# Altium integrated library CB3-ECB.IntLib: 66 symbols (continued)
## CMP-062-000000-4
designator R?, comment value 10kΩ  (hidden comment: EXB-28V103JX)
Res Thick Film Array 10KΩ 5% ±200ppm/°C ISOL 8-Pin 0804(4 X 0402) Convex SMD Automotive T/R; Circuit Type: Isolated; Number of Contacts: 8; Number of Elements: 4; Power Dissipation: 63mW; Power Per Element: 62.5mW; Voltage Rating (DC): 100V; Voltage Rating: 50V; Tolerance: 5%; Case/Package: 0804; Case Code (Imperial): 0402; Case Code (Metric): 1005; Depth: 1mm; Height: 0.35mm; Lead Free: Lead Free; Length: 2mm; Max Operating Temperature: 125°C; Military Standard: Not; Min Operating Temperature: -55°C; Mounting Technology: Surface Mount; Number of Resistors: 4; Package Quantity: 1; Packaging: Tape and Reel; Pins: 8; Power Rating: 62.5mW; Radiation Hardening: No; Reach SVHC Compliant: Unknown; Resistance Tolerance: 5%; RoHS Compliant: Yes; Series: EXB; Technology: THICK FILM; Temperature Coefficient: 200ppm/°C; Terminal Pitch: 0.5mm; Termination: Convex; Width: 1mm
footprint RESQUAD0804 (General 0804 Quad Resisor Array Footprint, Body 2.0x1.2mm)
part A pins: 1, 8
part B pins: 2, 7
part C pins: 3, 6
part D pins: 4, 5

## CMP-0062-01754-3
designator U?, comment LM2937IMP-3.3/NOPB
400mA and 500mA Voltage Regulator, 4-pin SOT-223, Pb-Free; Manufacturer: Texas Instruments; CompType: LDO IC; PowerWise: N; PackageTopMarking: XYTT*L69B; PackageReference: DCY0004A; PackageDescription: Molded SOT-223, 6.50 x 3.56 x 1.6mm Body, 4 Lead, 2.3mm Pitch; ComponentLink1Description: Datasheet URL; Code_IPC: SOT223-4; ComponentLink1URL: http://www.ti.com/general/docs/lit/getliterature.tsp?genericPartNumber=LM2937-3.3&fileType=pdf; RoHS: Y; PinCount: 4; Code_JEDEC: TO-261-AA
footprint DCY0004A_M (SOT223, 4-Leads, Body 6.7x3.7mm, Pitch 2.3mm, IPC Low Density)
footprint DCY0004A_N (SOT223, 4-Leads, Body 6.7x3.7mm, Pitch 2.3mm, IPC Medium Density)
footprint DCY0004A_L (SOT223, 4-Leads, Body 6.7x3.7mm, Pitch 2.3mm, IPC High Density)
pins: 1 IN (power), 2 GND (power), 3 OUT (power), 4 TAB (power)

## CMP-00068-6
designator FL?, comment BNX024H01L
EMI Filter Block 15A 50VDC Flat Style SMD Automotive Embossed T/R
footprint FP-BNX02-MFG (BNX02 Package)
pins: 1 B, 2 CB, 3 PSG, 4 CG

## CMP-070-000025-6
designator P?, comment M20-9990245
Connector Header Through Hole 2 position 0.100" (2.54mm); Max Current Rating: 3A; Voltage Rating (AC): 750V; Number of Contacts: 2; Contact Resistance: 25mR; Gender: Male; Insulation Resistance: 10GR; Mating Cycles: 300; Mated Stacking Heights: 16.54mm; Voltage: 50V; Packaging: Bulk; Min Operating Temperature: -40°C; Series: M20; Contact Material: Brass,Bronze; Number of Rows: 1; Housing Material: Nylon; Housing Color: Black; Termination: Solder; Contact Plating: Gold; Mounting Technology: Through Hole; Contact Type: Male Pin; Pitch: 2.54mm; Number of Positions: 2; Max Operating Temperature: 105°C; Reach SVHC Compliant: No; Length: 5.08mm; Radiation Hardening: No; Current Rating: 3A; Package Quantity: 1000; Orientation: Straight; Depth: 2.54mm; Fastening Type: Pull; Insulation Color: Black; Flammability Rating: UL94 V-0; Lead Pitch: 2.54mm; Insulation Material: Nylon; Contact Finish - Mating: GOLD; Current: 3A; Voltage Rating (DC): 750V; Number of Poles: 2; Contact Shape: Square; Working Voltage: 750V
footprint M20-9990245 (Connector Header Through Hole 2 position 0.100" (2.54mm))
pins: 1, 2

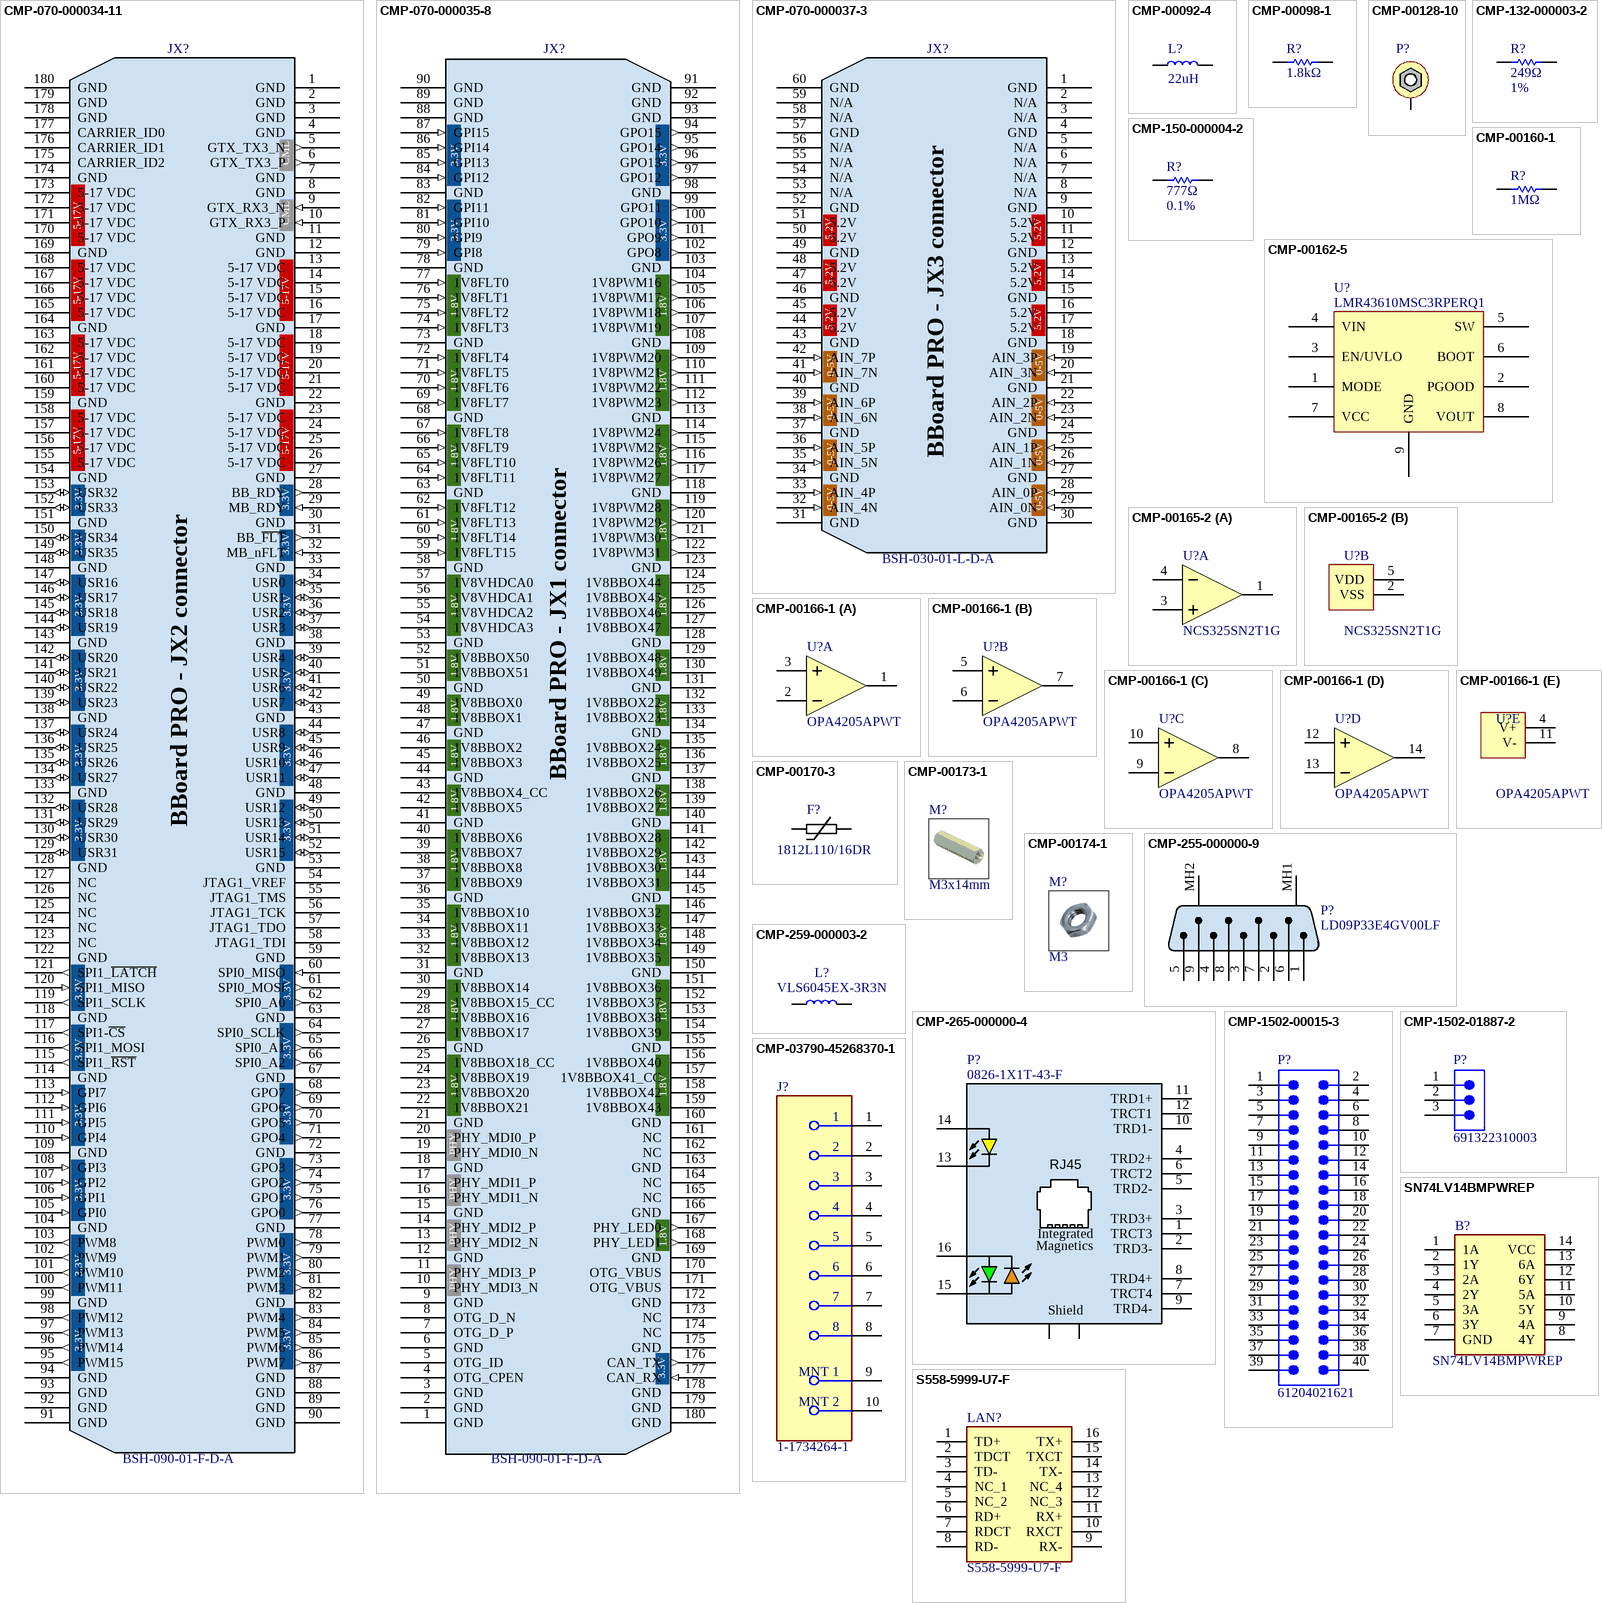
[diagram p2: symbols CMP-070-000034-11 to SN74LV14BMPWREP]

## CMP-070-000034-11
designator JX?, comment BSH-090-01-F-D-A
JX2 for BBoard; Max Current Rating: 1.25A; Number of Positions: 180; Max Voltage Rating (AC): 125V; Gender: Female; Mated Stacking Heights: 5mm; Pitch: 0.5mm; Contact Plating: Gold; Length: 51.27mm; Max Operating Temperature: 125°C; Depth: 7.24mm; Series: BSH; Mounting Technology: Surface Mount; Radiation Hardening: No; Orientation: Straight; Packaging: Bulk; Min Operating Temperature: -55°C; Termination: Solder; Number of Rows: 2; Contact Material: Bronze; Housing Material: Polymer; Height: 3.25mm; Number of Contacts: 180; RoHS Compliant: Yes
footprint BSH-090-01-F-D-A (Conn Micro Socket SKT 180 POS 0.5mm Solder ST SMD Automotive Tray)
pins: 1 GND (power), 2 GND (power), 3 GND (power), 4 GND (power), 5 GTX_TX3_N (out), 6 GTX_TX3_P (out), 7 GND (power), 8 GND (power), 9 GTX_RX3_N (in), 10 GTX_RX3_P (in), 11 GND (power), 12 GND (power), 13 5-17 VDC (power), 14 5-17 VDC (power), 15 5-17 VDC (power), 16 5-17 VDC (power), 17 GND (power), 18 5-17 VDC (power), 19 5-17 VDC (power), 20 5-17 VDC (power), 21 5-17 VDC (power), 22 GND (power), 23 5-17 VDC (power), 24 5-17 VDC (power), 25 5-17 VDC (power), 26 5-17 VDC (power), 27 GND (power), 28 BB_RDY (out), 29 MB_RDY (in), 30 GND (power), 31 BB_~{FLT} (out), 32 MB_nFLT (in), 33 GND (power), 34 USR0 (io), 35 USR1 (io), 36 USR2 (io), 37 USR3 (io), 38 GND (power), 39 USR4 (io), 40 USR5 (io), 41 USR6 (io), 42 USR7 (io), 43 GND (power), 44 USR8 (io), 45 USR9 (io), 46 USR10 (io), 47 USR11 (io), 48 GND (power), 49 USR12 (io), 50 USR13 (io), 51 USR14 (io), 52 USR15 (io), 53 GND (power), 54 JTAG1_VREF, 55 JTAG1_TMS, 56 JTAG1_TCK, 57 JTAG1_TDO, 58 JTAG1_TDI, 59 GND (power), 60 SPI0_MISO (in), 61 SPI0_MOSI (out), 62 SPI0_A0 (out), 63 GND (power), 64 SPI0_SCLK (out), 65 SPI0_A1 (out), 66 SPI0_A2 (out), 67 GND (power), 68 GPO7 (out), 69 GPO6 (out), 70 GPO5 (out), 71 GPO4 (out), 72 GND (power), 73 GPO3 (out), 74 GPO2 (out), 75 GPO1 (out), 76 GPO0 (out), 77 GND (power), 78 PWM0 (out), 79 PWM1 (out), 80 PWM2 (out), 81 PWM3 (out), 82 GND (power), 83 PWM4 (out), 84 PWM5 (out), 85 PWM6 (out), 86 PWM7 (out), 87 GND (power), 88 GND (power), 89 GND (power), 90 GND (power), 91 GND (power), 92 GND (power), 93 GND (power), 94 GND (power), 95 PWM15 (out), 96 PWM14 (out), 97 PWM13 (out), 98 PWM12 (out), 99 GND (power), 100 PWM11 (out), 101 PWM10 (out), 102 PWM9 (out), 103 PWM8 (out), 104 GND (power), 105 GPI0 (in), 106 GPI1 (in), 107 GPI2 (in), 108 GPI3 (in), 109 GND (power), 110 GPI4 (in), 111 GPI5 (in), 112 GPI6 (in), 113 GPI7 (in), 114 GND (power), 115 SPI1_~{RST} (out), 116 SPI1_MOSI (out), 117 SPI1-~{CS} (out), 118 GND (power), 119 SPI1_SCLK (out), 120 SPI1_MISO (in), 121 SPI1_~{LATCH} (out), 122 GND (power), 123 NC, 124 NC, 125 NC, 126 NC, 127 NC, 128 GND (power), 129 USR31 (io), 130 USR30 (io), 131 USR29 (io), 132 USR28 (io), 133 GND (power), 134 USR27 (io), 135 USR26 (io), 136 USR25 (io), 137 USR24 (io), 138 GND (power), 139 USR23 (io), 140 USR22 (io), 141 USR21 (io), 142 USR20 (io), 143 GND (power), 144 USR19 (io), 145 USR18 (io), 146 USR17 (io), 147 USR16 (io), 148 GND (power), 149 USR35 (io), 150 USR34 (io), 151 GND (power), 152 USR33 (io), 153 USR32 (io), 154 GND (power), 155 5-17 VDC (power), 156 5-17 VDC (power), 157 5-17 VDC (power), 158 5-17 VDC (power), 159 GND (power), 160 5-17 VDC (power), 161 5-17 VDC (power), 162 5-17 VDC (power), 163 5-17 VDC (power), 164 GND (power), 165 5-17 VDC (power), 166 5-17 VDC (power), 167 5-17 VDC (power), 168 5-17 VDC (power), 169 GND (power), 170 5-17 VDC (power), 171 5-17 VDC (power), 172 5-17 VDC (power), 173 5-17 VDC (power), 174 GND (power), 175 CARRIER_ID2, 176 CARRIER_ID1, 177 CARRIER_ID0, 178 GND (power), 179 GND (power), 180 GND (power)
text: CML; 5-17V; 3.3V; BBoard PRO - JX2 connector

## CMP-070-000035-8
designator JX?, comment BSH-090-01-F-D-A
JX1 for BBoard; Max Current Rating: 1.25A; Gender: Female; Number of Contacts: 180; Pitch: 0.5mm; Mated Stacking Heights: 5mm; Max Voltage Rating (AC): 125V; Min Operating Temperature: -55°C; RoHS Compliant: Yes; Number of Rows: 2; Max Operating Temperature: 125°C; Radiation Hardening: No; Packaging: Bulk; Termination: Solder; Height: 3.25mm; Orientation: Straight; Depth: 7.24mm; Series: BSH; Housing Material: Polymer; Length: 51.27mm; Mounting Technology: Surface Mount; Number of Positions: 180; Contact Material: Bronze; Contact Plating: Gold
footprint BSH-090-01-F-D-A (Conn Micro Socket SKT 180 POS 0.5mm Solder ST SMD Automotive Tray)
pins: 1 GND (power), 2 GND (power), 3 GND (power), 4 OTG_CPEN, 5 OTG_ID, 6 GND (power), 7 OTG_D_P, 8 OTG_D_N, 9 GND (power), 10 PHY_MDI3_N, 11 PHY_MDI3_P, 12 GND (power), 13 PHY_MDI2_N, 14 PHY_MDI2_P, 15 GND (power), 16 PHY_MDI1_N, 17 PHY_MDI1_P, 18 GND (power), 19 PHY_MDI0_N, 20 PHY_MDI0_P, 21 GND (power), 22 1V8BBOX21, 23 1V8BBOX20, 24 1V8BBOX19, 25 1V8BBOX18_CC, 26 GND (power), 27 1V8BBOX17, 28 1V8BBOX16, 29 1V8BBOX15_CC, 30 1V8BBOX14, 31 GND (power), 32 1V8BBOX13, 33 1V8BBOX12, 34 1V8BBOX11, 35 1V8BBOX10, 36 GND (power), 37 1V8BBOX9, 38 1V8BBOX8, 39 1V8BBOX7, 40 1V8BBOX6, 41 GND (power), 42 1V8BBOX5, 43 1V8BBOX4_CC, 44 GND (power), 45 1V8BBOX3, 46 1V8BBOX2, 47 GND (power), 48 1V8BBOX1, 49 1V8BBOX0, 50 GND (power), 51 1V8BBOX51, 52 1V8BBOX50, 53 GND (power), 54 1V8VHDCA3, 55 1V8VHDCA2, 56 1V8VHDCA1, 57 1V8VHDCA0, 58 GND (power), 59 1V8FLT15 (in), 60 1V8FLT14 (in), 61 1V8FLT13 (in), 62 1V8FLT12 (in), 63 GND (power), 64 1V8FLT11 (in), 65 1V8FLT10 (in), 66 1V8FLT9 (in), 67 1V8FLT8 (in), 68 GND (power), 69 1V8FLT7 (in), 70 1V8FLT6 (in), 71 1V8FLT5 (in), 72 1V8FLT4 (in), 73 GND (power), 74 1V8FLT3 (in), 75 1V8FLT2 (in), 76 1V8FLT1 (in), 77 1V8FLT0 (in), 78 GND (power), 79 GPI8 (in), 80 GPI9 (in), 81 GPI10 (in), 82 GPI11 (in), 83 GND (power), 84 GPI12 (in), 85 GPI13 (in), 86 GPI14 (in), 87 GPI15 (in), 88 GND (power), 89 GND (power), 90 GND (power), 91 GND (power), 92 GND (power), 93 GND (power), 94 GPO15 (out), 95 GPO14 (out), 96 GPO13 (out), 97 GPO12 (out), 98 GND (power), 99 GPO11 (out), 100 GPO10 (out), 101 GPO9 (out), 102 GPO8 (out), 103 GND (power), 104 1V8PWM16 (out), 105 1V8PWM17 (out), 106 1V8PWM18 (out), 107 1V8PWM19 (out), 108 GND (power), 109 1V8PWM20 (out), 110 1V8PWM21 (out), 111 1V8PWM22 (out), 112 1V8PWM23 (out), 113 GND (power), 114 1V8PWM24 (out), 115 1V8PWM25 (out), 116 1V8PWM26 (out), 117 1V8PWM27 (out), 118 GND (power), 119 1V8PWM28 (out), 120 1V8PWM29 (out), 121 1V8PWM30 (out), 122 1V8PWM31 (out), 123 GND (power), 124 1V8BBOX44, 125 1V8BBOX45, 126 1V8BBOX46, 127 1V8BBOX47, 128 GND (power), 129 1V8BBOX48, 130 1V8BBOX49, 131 GND (power), 132 1V8BBOX22, 133 1V8BBOX23, 134 GND (power), 135 1V8BBOX24, 136 1V8BBOX25, 137 GND (power), 138 1V8BBOX26, 139 1V8BBOX27, 140 GND (power), 141 1V8BBOX28, 142 1V8BBOX29, 143 1V8BBOX30, 144 1V8BBOX31, 145 GND (power), 146 1V8BBOX32, 147 1V8BBOX33, 148 1V8BBOX34, 149 1V8BBOX35, 150 GND (power), 151 1V8BBOX36, 152 1V8BBOX37, 153 1V8BBOX38, 154 1V8BBOX39, 155 GND (power), 156 1V8BBOX40, 157 1V8BBOX41_CC, 158 1V8BBOX42, 159 1V8BBOX43, 160 GND (power), 161 NC, 162 NC, 163 GND (power), 164 NC, 165 NC, 166 GND (power), 167 PHY_LED0 (out), 168 PHY_LED1 (out), 169 GND (power), 170 OTG_VBUS, 171 OTG_VBUS, 172 GND (power), 173 NC, 174 NC, 175 GND (power), 176 CAN_TX (out), 177 CAN_RX (in), 178 GND (power), 179 GND (power), 180 GND (power)
text: 3.3V; 1.8V; BBoard PRO - JX1 connector; PHY

## CMP-070-000037-3
designator JX?, comment BSH-030-01-L-D-A
JX3 for BBoard; Number of Contacts: 60; Pitch: 0.5mm; Gender: Female; Mated Stacking Heights: 5mm; Number of Rows: 2; Contact Plating: Gold; Series: BSH; Number of Positions: 60; Radiation Hardening: No; RoHS Compliant: Yes; Termination: Solder; Packaging: Tray
footprint BSH-030-01-L-D-A (Conn Micro Socket SKT 60 POS 0.5mm Solder ST SMD Automotive Tray)
pins: 1 GND (power), 2 N/A, 3 N/A, 4 GND (power), 5 N/A, 6 N/A, 7 N/A, 8 N/A, 9 GND (power), 10 5.2V (power), 11 5.2V (power), 12 GND (power), 13 5.2V (power), 14 5.2V (power), 15 GND (power), 16 5.2V (power), 17 5.2V (power), 18 GND (power), 19 AIN_3P (in), 20 AIN_3N (in), 21 GND (power), 22 AIN_2P (in), 23 AIN_2N (in), 24 GND (power), 25 AIN_1P (in), 26 AIN_1N (in), 27 GND (power), 28 AIN_0P (in), 29 AIN_0N (in), 30 GND (power), 31 GND (power), 32 AIN_4N (in), 33 AIN_4P (in), 34 GND (power), 35 AIN_5N (in), 36 AIN_5P (in), 37 GND (power), 38 AIN_6N (in), 39 AIN_6P (in), 40 GND (power), 41 AIN_7N (in), 42 AIN_7P (in), 43 GND (power), 44 5.2V (power), 45 5.2V (power), 46 GND (power), 47 5.2V (power), 48 5.2V (power), 49 GND (power), 50 5.2V (power), 51 5.2V (power), 52 GND (power), 53 N/A, 54 N/A, 55 N/A, 56 N/A, 57 GND (power), 58 N/A, 59 N/A, 60 GND (power)
text: 0-5V; BBoard PRO - JX3 connector

## CMP-00092-4
designator L?, comment value 22uH  (hidden comment: 84223C)
Inductor Power Wirewound 22uH 10% 0.6A 0.6Ohm DCR 1812; Shielding: Unshielded; DC Resistance (DCR): 600mR; Max DC Current: 600mA; Min Operating Temperature: -40°C; Depth: 3.6mm; Termination: SMD/SMT; Packaging: Tape and Reel; Case/Package: Nonstandard; Max Operating Temperature: 125°C; Width: 3.3mm; Length: 4.5mm; Height: 2.6mm; Series: 8400; Mounting Technology: Surface Mount; RoHS Compliant: Yes; Tolerance: 10%; Radiation Hardening: No
footprint Inductor 8400 Serie (Precision Wire Wound Inductor, 2-Leads, Body 4.50x3.30mm)
pins: 1, 2

## CMP-00098-1
designator R?, comment value 1.8kΩ  (hidden comment: RES-1.8KΩ-1/8W-25PPM-0603-0.1%)
RES SMD 1.8KΩ 1/8W 25PPM 0603 0.1% (Generic Imperix Component); Temperature Coefficient: 25ppm/°C; Tolerance: 0.1%; Power Rating: 1/8W; Case/Package: 0603
footprint RESC1608L(0603) (General 0603 Resistor Footprint, Body 1.6x0.8mm, IPC High Density)
pins: 1, 2

## CMP-00128-10
designator P?, comment Spacer M3 connected  (value not drawn)  (no BOM)
Hole and pad for spacer M3; Outside diameter SW: 5.5mm; Thread Size: M3
footprint Spacer M3 connected (Hole and pad for spacer M3, Sw=5.5mm)
pins: 1 0

## CMP-132-000003-2
designator R?, comment value 249Ω  Tolerance: 1%  (hidden comment: RES-249Ω-1/16W-100PPM-0402-1%)
RES SMD 249Ω 1/16W 100PPM 0402 1% (Generic Imperix Component); Temperature Coefficient: 100ppm/°C; Power Rating: 1/16W; Case/Package: 0402
footprint RESC1005L(0402) (General 0402 Resistor Footprint, Body 1.1x0.5mm, IPC High Density)
pins: 1, 2

## CMP-150-000004-2
designator R?, comment value 777Ω  Tolerance: 0.1%  (hidden comment: RES-777Ω-1/16W-25PPM-0402-0.1%)
RES SMD 777Ω 1/16W 25PPM 0402 0.1% (Generic Imperix Component); Temperature Coefficient: 25ppm/°C; Power Rating: 1/16W; Case/Package: 0402
footprint RESC1005L(0402) (General 0402 Resistor Footprint, Body 1.1x0.5mm, IPC High Density)
pins: 1, 2

## CMP-00160-1
designator R?, comment value 1MΩ  (hidden comment: RES-1MΩ-1/16W-100PPM-0402-1%)
RES SMD 1MΩ 1/16W 100PPM 0402 1% (Generic Imperix Component); Temperature Coefficient: 100ppm/°C; Tolerance: 1%; Case/Package: 0402; Power Rating: 1/16W
footprint RESC1005L(0402) (General 0402 Resistor Footprint, Body 1.1x0.5mm, IPC High Density)
pins: 1, 2

## CMP-00162-5
designator U?, comment LMR43610MSC3RPERQ1
LMR436x0, 36-V, 1-A Buck Converter
footprint LMR43610MSC3RPERQ1
pins: 1 MODE, 2 PGOOD, 3 EN/UVLO, 4 VIN, 5 SW, 6 BOOT, 7 VCC, 8 VOUT, 9 GND

## CMP-00165-2
designator U?, comment NCS325SN2T1G
Single Operational Amplifier, 50 µV Offset, 0.25 µV/°C, Zero-Drift Precision, Low Power; Output Current per Channel: 5mA; Input Offset Voltage (Vos): 14uV; Input Bias Current: 50pA; Slew Rate: 0.16V/µs; Gain Bandwidth Product: 350kHz; Operating Supply Current: 21uA; Number of Circuits: 1; RoHS Compliant: Yes; Series: -; Case/Package: SOT-23-5; Packaging: Tape and Reel; Max Operating Temperature: 125°C; Mounting Technology: Surface Mount; Min Operating Temperature: -40°C; Lead Free: Lead Free
footprint SOT23-5AL (General SOT23-5 Footprint, 5-Leads, Body 2.90x1.60mm, Pitch 0.95mm, IPC High Density)
part A pins: 1 OUT, 3 IN+, 4 IN-
part B pins: 2 VSS (power), 5 VDD (power)

## CMP-00166-1
designator U?, comment OPA4205APWT
Precision Amplifiers Low-power low-noise four-channel precision amplifier with e-trim and super-beta inputs; Number of Channels: 4; Operating Supply Current: 0.24mA; Gain Bandwidth Product: 3.6MHz; Input Offset Voltage (Vos): 2uV; Input Bias Current: 100pA; Slew Rate: 4V/µs; Max Operating Temperature: 85°C; Pins: 14; Number of Circuits: 4; Packaging: Tape and Reel; Mounting Technology: Surface Mount; Case/Package: TSSOP-14; RoHS Compliant: Yes; Min Operating Temperature: -40°C
footprint TSSOP65P640-14N (General TSSOP Footprint, 14-Leads, Body 5.00x4.50mm, Pitch 1.00mm, IPC Medium Density)
part A pins: 1 OUT, 2 IN-, 3 IN+
part B pins: 5 IN+, 6 IN-, 7 OUT
part C pins: 8 OUT, 9 IN-, 10 IN+
part D pins: 12 IN+, 13 IN-, 14 OUT
part E pins: 4 V+ (power), 11 V- (power)

## CMP-00170-3
designator F?, comment 1812L110/16DR
PTC Resettable Fuse 1.1A(hold)  1.95A(trip) 16VDC 1812; Max Voltage Rating (DC): 16V; Approvals: cULus,TUV; Value: 180mR; Max Power Dissipation: 800mW; Max Current Rating: 100A; Time to Trip: 300ms; Hold Current: 1.1A; Width: 4.73mm; Max Operating Temperature: 85°C; Trip Current: 1.95A; Case Code (Metric): 4532; Mounting Technology: Surface Mount; Packaging: Tape and Reel; Case Code (Imperial): 1812; RoHS Compliant: Yes; Case/Package: 1812; Series: 1812L; Power Dissipation: 800mW; Package Quantity: 1500; Current Rating: 100A; Lead Free: Lead Free; Termination: SMD/SMT; Operating Supply Voltage: 16V; Min Operating Temperature: -40°C; Voltage Rating (DC): 16V; Reach SVHC Compliant: Unknown; Working Voltage: 16V
footprint PTC Fuse(1812) (1812 PTC Fuse Footprint, Body 4.5x3.2mm, IPC High Density)
pins: 1, 2

## CMP-00173-1
designator M?, comment value M3x14mm  (hidden comment: 1382748)  (mechanical)
Brass Spacer M3x14mm  Metric Thread int./int.; Plating: Nickel; Gender: Female, Female; Threaded/Unthreaded: Threaded; Color: Silver; Material: Brass

## CMP-00174-1
designator M?, comment value M3  (hidden comment: 1090615)  (mechanical)
M3 Hex jam nuts; Thread size: M3; Thickness: 1.8mm

## CMP-255-000000-9
designator P?, comment LD09P33E4GV00LF
Conn D-Subminiature PIN 9 POS 2.74mm Solder RA Thru-Hole 9 Terminal 1 Port; Manufacturer_Name: Amphenol Communications Solutions; Connector Type: D-Sub,Plug; Voltage Rating: 250V; Geometry.Height: 12.96mm; Number of Positions: 9; Current Rating: 5A; Design Item ID: LD09P33E4GV00LF; Min Operating Temperature: -55°C; Number of Rows: 2; Housing Material: Thermoplastic; Color: Black; Contact Type: Signal; Series: LD; Mounting Technology: Through Hole; Contact Plating: Gold; Termination: Solder; Manufacturer_Part_Number: LD09P33E4GV00LF; Packaging: Bulk; Max Operating Temperature: 105°C
footprint LD09P33E4GV00LF (Conn D-Subminiature PIN 9 POS 2.74mm Solder RA Thru-Hole 9 Terminal 1 Port)
pins: 1, 2, 3, 4, 5, 6, 7, 8, 9, MH1 SH, MH2 SH

## CMP-259-000003-2
designator L?, comment VLS6045EX-3R3N
Inductor Power Shielded Wirewound 3.3uH 30% 100KHz Ferrite 4.95A 0.0299Ohm DCR 2424 T/R; DC Resistance (DCR): 30mR; Saturation Current: 6.5A; Shielding: Shielded; Mounting Technology: Surface Mount; Core Material: Ferrite; Length: 0.236inch; Current Rating: 4.95A; Test Frequency: 100kHz; Height - Seated (Max): 0.177inch; Inductance Tolerance: 30%; RMS Current (Irms): 4.95A; Reach SVHC Compliant: No; Tolerance: 30%; Case/Package: Nonstandard; Width: 0.236inch; RoHS Compliant: Yes; Packaging: Cut Tape; Value: 3.3uH; Series: VLS-EX; Max Operating Temperature: 105°C; Min Operating Temperature: -40°C
footprint VLS6045EX (VLS-EX series -  TDK Inductors for power circuits)
pins: 1, 2

## CMP-265-000000-4
designator P?, comment 0826-1X1T-43-F
Conn Modular Jack RCP 12 POS 2.03mm Solder RA Thru-Hole 16 Terminal 1 Port Tray; Number of Ports: 1; Direction: Up; Number of Positions Loaded: 12; Shielding: Shielded; Number of Cores per Jack: 8; Gender: Female; Connector Type: RJ45; Orientation: Right Angle; Pitch: 2.03mm; Availability: Unavailable; Series: MagJack®; Value: 0826-1X1T-43-F; Packaging: Tray; Pin Count: 18; Color: Green,Orange,Yellow; Max Operating Temperature: 70°C; Depth: 15.01mm; Number of Contacts: 12; Housing Material: Polyamide; Design Item ID: 0826-1X1T-43-F; Component Type: Standard; Length: 19.15mm; Min Operating Temperature: 0°C; Termination: Solder; Number of Rows: 1; Contact Material: Copper Alloy; Mounting Technology: Through Hole; Contact Plating: Gold
footprint BEL_0826-1X1T-43-F (Conn Modular Jack RCP 12 POS 2.03mm Solder RA Thru-Hole 16 Terminal 1 Port Tray)
pins: 1 TRCT3, 2 TRD3-, 3 TRD3+, 4 TRD2+, 5 TRD2-, 6 TRCT2, 7 TRCT4, 8 TRD4+, 9 TRD4-, 10 TRD1-, 11 TRD1+, 12 TRCT1, 13, 14, 15, 16, S1 SHIELD, S2 SHIELD
text: Integrated; Magnetics; Shield

## CMP-1502-00015-3
designator P?, comment 61204021621
NexarPartId: 25903616; Gender: Male; Row Spacing: 2.54mm; Connector Type: Male Pin; Current Rating: 3A; Number of Positions: 40; Voltage Rating: 250V; Insulation Resistance: 1GΩ; Contact Resistance: 20mΩ; RoHS: Compliant; Color: Black; Pitch: 2.54mm; Orientation: Vertical; Contact Plating: Gold; Lead Pitch: 2.54mm; REACH SVHC: Unknown; Termination: Solder; Max Operating Temperature: 105°C; Insulation Material: PBT; Number of Rows: 2; Min Operating Temperature: -40°C; Number of Pins: 40; Mount: Through Hole; Contact Material: Copper; Number of Contacts: 40; Height: 9.25mm; Length: 58.46mm; Operating Supply Voltage: 250V
footprint 61204021621 (WR-BHD Straight Male, Box Header, Through Hole, 2 Rows, 40 Contacts, 2.54mm Pitch)
pins: 1, 2, 3, 4, 5, 6, 7, 8, 9, 10, 11, 12, 13, 14, 15, 16, 17, 18, 19, 20, 21, 22, 23, 24, 25, 26, 27, 28, 29, 30, 31, 32, 33, 34, 35, 36, 37, 38, 39, 40

## CMP-1502-01887-2
designator P?, comment 691322310003
NexarPartId: 8917778; Pitch: 3.81mm; Number of Positions Per Level: 3; Current: 10A; Voltage: 300V; Number of Levels: 1; Gender: Male; Termination: Solder; Number of Rows: 1; Contact Plating: Tin; Packaging: Box; Height: 9.2mm; Mount: Through Hole; Number of Contacts: 3; Width: 12.82mm; Lead Pitch: 3.81mm; REACH SVHC: Unknown; RoHS: Compliant; Length: 10.5mm; Number of Pins: 3; Color: Green; Contact Material: Brass
footprint 691322310003 (322; 3.81mm Pitch Straight Pluggable Term Block; PCB Header; Through Hole; 3 Way)
pins: 1, 2, 3

## CMP-03790-45268370-1
designator J?, comment 1-1734264-1
1-1734264-1 Conn Modular Jack F 8 POS 1.02mm Solder RA Thru-Hole 8 Terminal 1 Port Cat 5 Box/Tray; Manufacturer Lifecycle Status: ACTIVE; NexarPartId: 45268370; Element Configuration: Single; PCB Mounting Orientation: Right Angle; Keyed: No; Number of Positions Loaded: 8; Tail Length: 2.79mm; Shielding: Yes; PCB Thickness: 1.6mm; Circuit Application: Signal; Voltage Rating: 150V; Current Rating: 1A; Lead Free: Lead Free; Contact Plating: Gold; Radiation Hardening: No; Max Operating Temperature: 85°C; RoHS: Compliant; Orientation: Right Angle; Height: 15.5mm; Lifecycle Status: Production; Termination: Solder; Contact Material: Bronze, Gold, Nickel; Min Operating Temperature: -40°C; Number of Contacts: 8; Contact Finish Thickness - Mating: 380nm; Packaging: Box; Color: Black; Housing Material: Thermoplastic; Housing Color: Black; Number of Positions: 8; ELV: Compliant; Flammability Rating: UL94 V-0
footprint FP-1-1734264-1-MFG (Conn Modular Jack F 8 POS 1.02mm Solder RA Thru-Hole 8 Terminal 1 Port Cat 5 Box/Tray)
pins: 1, 2, 3, 4, 5, 6, 7, 8, 9 MNT 1, 10 MNT 2

## S558-5999-U7-F
designator LAN?
Integrated Circuit; Manufacturer_Name: BelFuse; Datasheet Link: https://datasheet.datasheetarchive.com/originals/distributors/Datasheets_SAMA/db0cb1a0bfcf5d4689e4d1da1843e2e3.pdf; Height: 5.71mm; Manufacturer_Part_Number: S558-5999-U7-F; Mouser Part Number: 530-S558-5999-U7-F; Mouser Price/Stock: http://www.mouser.com/Search/ProductDetail.aspx?qs=SRYZG9HaIQ2NmzVD%252bSK3sg%3d%3d; Arrow Part Number: S558-5999-U7-F; Arrow Price/Stock: https://www.arrow.com/en/products/s558-5999-u7-f/bel-group
footprint SOIC127P920X571-16N
pins: 1 TD+, 2 TDCT, 3 TD-, 4 NC_1, 5 NC_2, 6 RD+, 7 RDCT, 8 RD-, 9 RX-, 10 RXCT, 11 RX+, 12 NC_3, 13 NC_4, 14 TX-, 15 TXCT, 16 TX+

## SN74LV14BMPWREP
designator B?
Buffers & Line Drivers Enhanced product six-channel 2-V to 5.5-V inverters with Schmitt-Trigger inputs 14-TSSOP -55 to 125; Manufacturer_Name: Texas Instruments; Geometry.Height: 1.2mm; Manufacturer_Part_Number: SN74LV14BMPWREP; Mouser Part Number: 595-SN74LV14BMPWREP; Mouser Price/Stock: https://www.mouser.co.uk/ProductDetail/Texas-Instruments/SN74LV14BMPWREP?qs=HoCaDK9Nz5fSnWYSOigIVw%3D%3D; Arrow Part Number: *; Arrow Price/Stock: *; Datasheet Link: https://www.ti.com/lit/ds/symlink/sn74lv14b-ep.pdf?ts=1721665849773&ref_url=https%253A%252F%252Fwww.ti.com%252Fproduct%252FSN74LV14B-EP%253Fbm-verify%253DAAQAAAAJ_____xCRxVYzN0ZP5KnI32M898cdzk_vVBOKhwrKmXlj3-P_3M_Mnh5G3rD7WBG7EyrGOmmHo91Qgihl-F3Dqbjb4gK-S
footprint SOP65P640X120-14N
pins: 1 1A, 2 1Y, 3 2A, 4 2Y, 5 3A, 6 3Y, 7 GND, 8 4Y, 9 4A, 10 5Y, 11 5A, 12 6Y, 13 6A, 14 VCC (power)